# Altium footprint library 4.49-接插件.PcbLib: 260 footprints (part 13 of 17)
Each footprint in its own frame and in the unit in brackets; x right, y up, seen from the top. Pads: shape width x height; smd on the part's side, far side on the other; paste and mask are expansions set on the pad; w line width, h text height; cw(c..) or ccw(c..) is an arc to the next point about the centre after c.
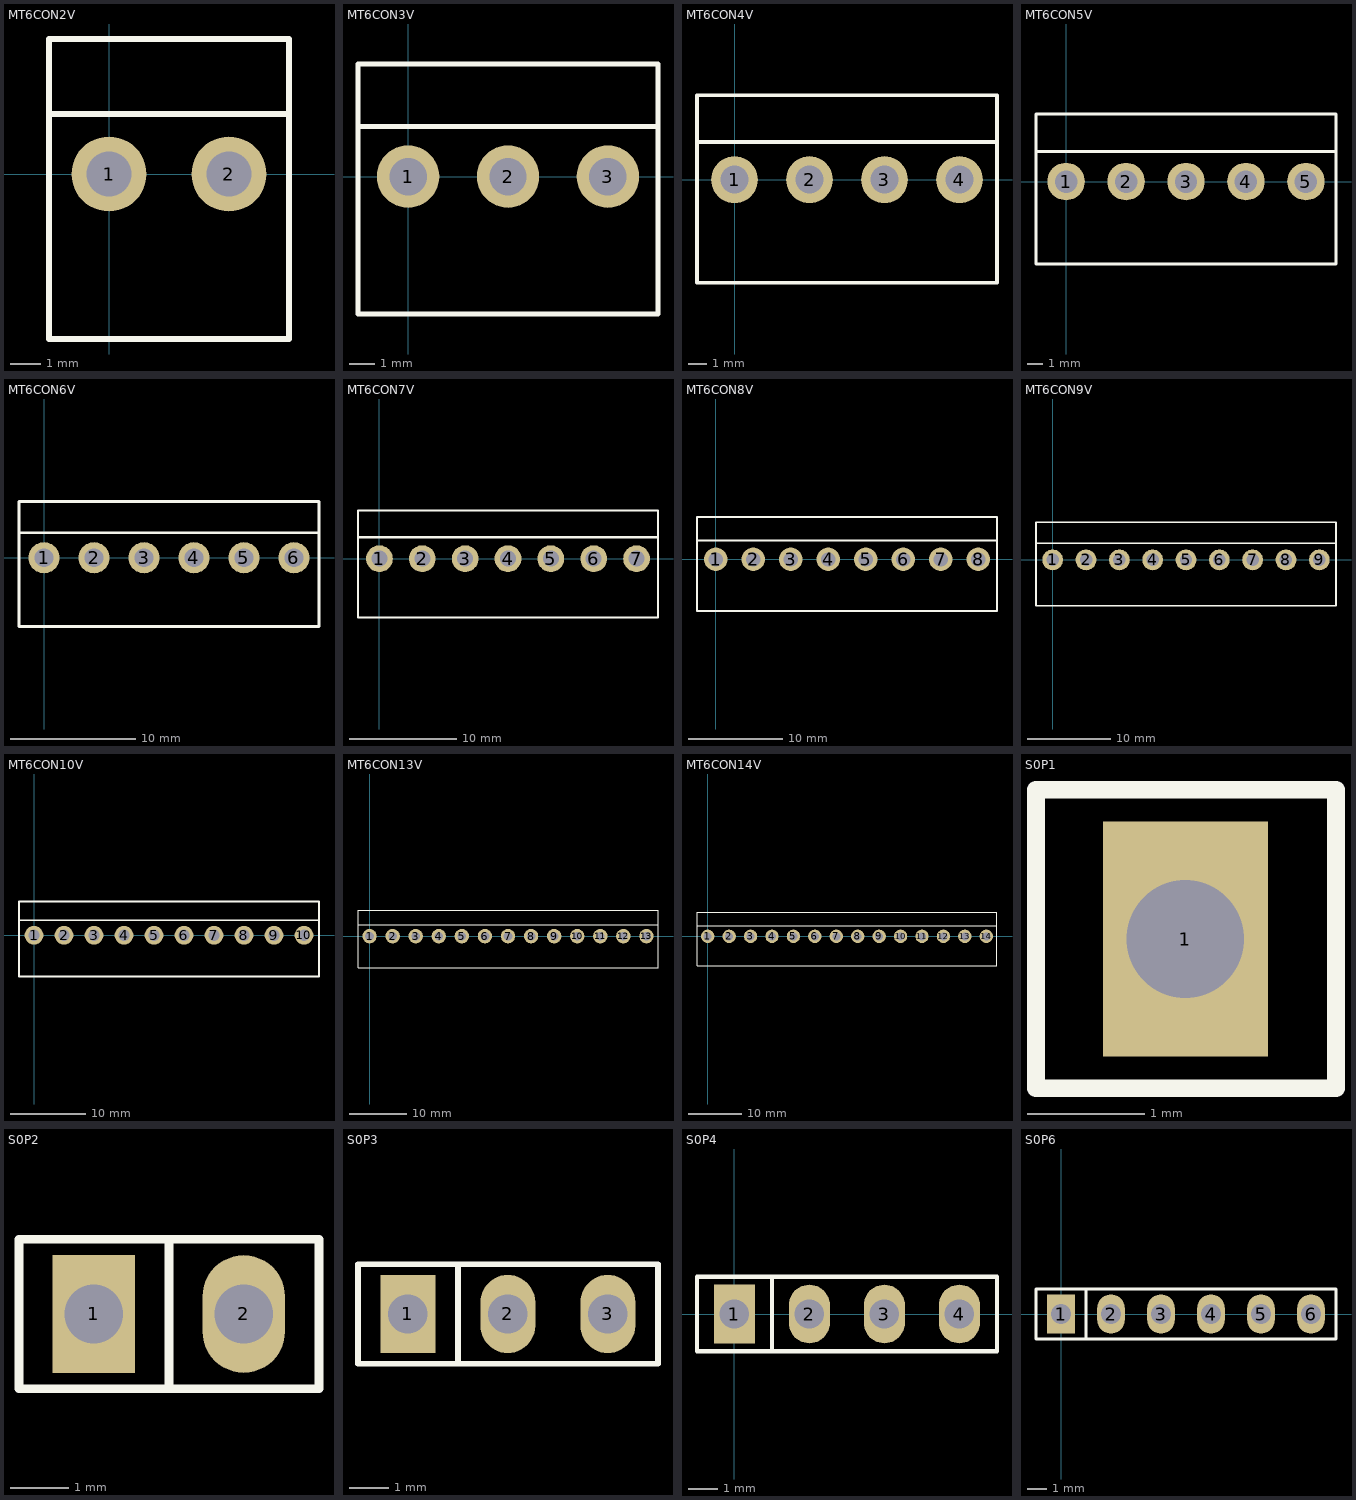
[diagram p12: the footprints below, top view; thin cyan lines are the x and y axes]

## MT6CON2V [mm]
pads (2):
  round 2.5 hole 1.5: 1(0,0) 2(4,0)
Top Overlay:
  lines w0.203: -2,2 6,2 ; -2,-5.5 -2,4.5 6,4.5 6,-5.5 -2,-5.5
3D body "User Library-PWL-2.step": height 13.8, standoff -3.6, extent -1.96,-5.601 5.96,4.799

## MT6CON3V [mm]
pads (3):
  round 2.5 hole 1.5: 1(0,0) 2(4,0) 3(8,0)
Top Overlay:
  lines w0.203: -2,2 10,2 ; -2,-5.5 10,-5.5 10,4.5 -2,4.5 -2,-5.5
3D body "User Library-PWL-3.step": height 13.8, standoff -3.6, extent -1.94,-5.601 9.94,4.799

## MT6CON4V [mm]
pads (4):
  round 2.5 hole 1.5: 1(0,0) 2(4,0) 3(8,0) 4(12,0)
Top Overlay:
  lines w0.203: -2,2 14,2 ; -2,-5.5 14,-5.5 14,4.5 -2,4.5 -2,-5.5
3D body "User Library-PWL-4.step": height 13.8, standoff -3.6, extent -1.92,-5.601 13.92,4.799

## MT6CON5V [mm]
pads (5):
  round 2.5 hole 1.5: 1(0,0) 2(4,0) 3(8,0) 4(12,0) 5(16,0)
Top Overlay:
  lines w0.203: -2,2 18,2 ; -2,-5.5 -2,4.5 18,4.5 18,-5.5 -2,-5.5
3D body "User Library-PWL-5.step": height 13.8, standoff -3.6, extent -1.9,-5.601 17.9,4.799

## MT6CON6V [mm]
pads (6):
  round 2.5 hole 1.5: 1(0,0) 2(4,0) 3(8,0) 4(12,0) 5(16,0) 6(20,0)
Top Overlay:
  lines w0.203: -2,2 22,2 ; -2,-5.5 22,-5.5 22,4.5 -2,4.5 -2,-5.5
3D body "User Library-PWL-6.step": height 13.8, standoff -3.6, extent -1.88,-5.601 21.88,4.799

## MT6CON7V [mm]
pads (7):
  round 2.5 hole 1.5: 1(0,0) 2(4,0) 3(8,0) 4(12,0) 5(16,0) 6(20,0) 7(24,0)
Top Overlay:
  lines w0.203: -2,2 26,2 ; -2,-5.5 -2,4.5 26,4.5 26,-5.5 -2,-5.5
3D body "User Library-PWL-7.step": height 13.8, standoff -3.6, extent -1.86,-5.601 25.86,4.799

## MT6CON8V [mm]
pads (8):
  round 2.5 hole 1.5: 1(0,0) 2(4,0) 3(8,0) 4(12,0) 5(16,0) 6(20,0) 7(24,0) 8(28,0)
Top Overlay:
  lines w0.203: -2,2 30,2 ; -2,-5.5 -2,4.5 30,4.5 30,-5.5 -2,-5.5
3D body "User Library-PWL-8.step": height 13.8, standoff -3.6, extent -1.84,-5.601 29.84,4.799

## MT6CON9V [mm]
pads (9):
  round 2.5 hole 1.5: 1(0,0) 2(4,0) 3(8,0) 4(12,0) 5(16,0) 6(20,0) 7(24,0) 8(28,0) 9(32,0)
Top Overlay:
  lines w0.203: -2,2 34,2 ; -2,-5.5 34,-5.5 34,4.5 -2,4.5 -2,-5.5
3D body "User Library-PWL-9.step": height 13.8, standoff -3.6, extent -1.82,-5.601 33.82,4.799

## MT6CON10V [mm]
pads (10):
  round 2.5 hole 1.5: 1(0,0) 2(4,0) 3(8,0) 4(12,0) 5(16,0) 6(20,0) 7(24,0) 8(28,0) 9(32,0) 10(36,0)
Top Overlay:
  lines w0.203: -2,2 38,2 ; -2,-5.5 38,-5.5 38,4.5 -2,4.5 -2,-5.5
3D body "User Library-PWL-10.step": height 13.8, standoff -3.6, extent -1.9,-5.601 37.9,4.799

## MT6CON13V [mm]
pads (13):
  round 2.5 hole 1.5: 1(0,0) 2(4,0) 3(8,0) 4(12,0) 5(16,0) 6(20,0) 7(24,0) 8(28,0) 9(32,0) 10(36,0) 11(40,0) 12(44,0) 13(48,0)
Top Overlay:
  lines w0.203: -2,2 50,2 ; -2,-5.5 50,-5.5 50,4.5 -2,4.5 -2,-5.5
3D body "User Library-PWL-13.step": height 13.8, standoff -3.6, extent -1.74,-5.601 49.74,4.799

## MT6CON14V [mm]
pads (14):
  round 2.5 hole 1.5: 1(0,0) 2(4,0) 3(8,0) 4(12,0) 5(16,0) 6(20,0) 7(24,0) 8(28,0) 9(32,0) 10(36,0) 11(40,0) 12(44,0) 13(48,0) 14(52,0)
Top Overlay:
  lines w0.203: -2,2 54,2 ; -2,-5.5 54,-5.5 54,4.5 -2,4.5 -2,-5.5
3D body "User Library-PWL-14.step": height 13.8, standoff -3.6, extent -1.72,-5.601 53.72,4.799

## S0P1 [mm]
pads (1):
  rect 1.4x2 hole 1: 1(50.8,101.6)
Top Overlay:
  lines w0.15: 52.06,100.33 49.53,100.33 49.53,102.87 52.07,102.87 ; 52.08,100.33 52.08,102.87

## S0P2 [mm]
pads (2):
  rect 1.4x2 hole 1: 1(50.8,101.6)
  oval 1.4x2 hole 1: 2(53.35,101.6)
Top Overlay:
  lines w0.15: 52.06,100.33 49.53,100.33 49.53,102.87 52.07,102.87 ; 54.61,100.33 52.08,100.33 52.08,102.87 54.62,102.87 ; 54.63,100.33 54.63,102.87
3D body "2.step": height 4.57, standoff -2.92, extent 49.54,100.33 54.62,102.87

## S0P3 [mm]
pads (3):
  rect 1.4x2 hole 1: 1(50.8,101.6)
  oval 1.4x2 hole 1: 2(53.35,101.6) 3(55.9,101.6)
Top Overlay:
  lines w0.15: 52.06,100.33 49.53,100.33 49.53,102.87 52.07,102.87 ; 54.61,100.33 52.08,100.33 52.08,102.87 54.62,102.87 ; 54.63,100.33 57.16,100.33 ; 54.63,102.87 57.17,102.87 ; 57.18,100.33 57.18,102.87

## S0P4 [mm]
pads (4):
  rect 1.4x2 hole 1: 1(0,0)
  oval 1.4x2 hole 1: 2(2.55,0) 3(5.1,0) 4(7.65,0)
Top Overlay:
  lines w0.15: 1.26,-1.27 -1.27,-1.27 -1.27,1.27 1.27,1.27 ; 3.81,-1.27 1.28,-1.27 1.28,1.27 3.82,1.27 ; 3.83,-1.27 8.93,-1.27 8.93,1.27 3.83,1.27
3D body "User Library-BL1-004-S842-55.step": height 8.42, standoff -3.2, extent -1.505,-1.27 9.155,1.27

## S0P6 [mm]
pads (6):
  rect 1.4x2 hole 1: 1(0,0)
  oval 1.4x2 hole 1: 2(2.54,0) 3(5.08,0) 4(7.62,0) 5(10.16,0) 6(12.7,0)
Top Overlay:
  lines w0.15: 1.27,-1.27 1.27,1.27 ; -1.27,-1.27 -1.27,1.27 13.97,1.27 13.97,-1.27 -1.27,-1.27
3D body "User Library-BL1-006-S842-55.step": height 8.42, standoff -3.2, extent -1.52,-1.27 14.22,1.27